# Altium footprint library FOC.PcbLib: 148 footprints (part 4 of 10)
Each footprint in its own frame and in the unit in brackets; x right, y up, seen from the top. Pads: shape width x height; smd on the part's side, far side on the other; paste and mask are expansions set on the pad; w line width, h text height; cw(c..) or ccw(c..) is an arc to the next point about the centre after c.
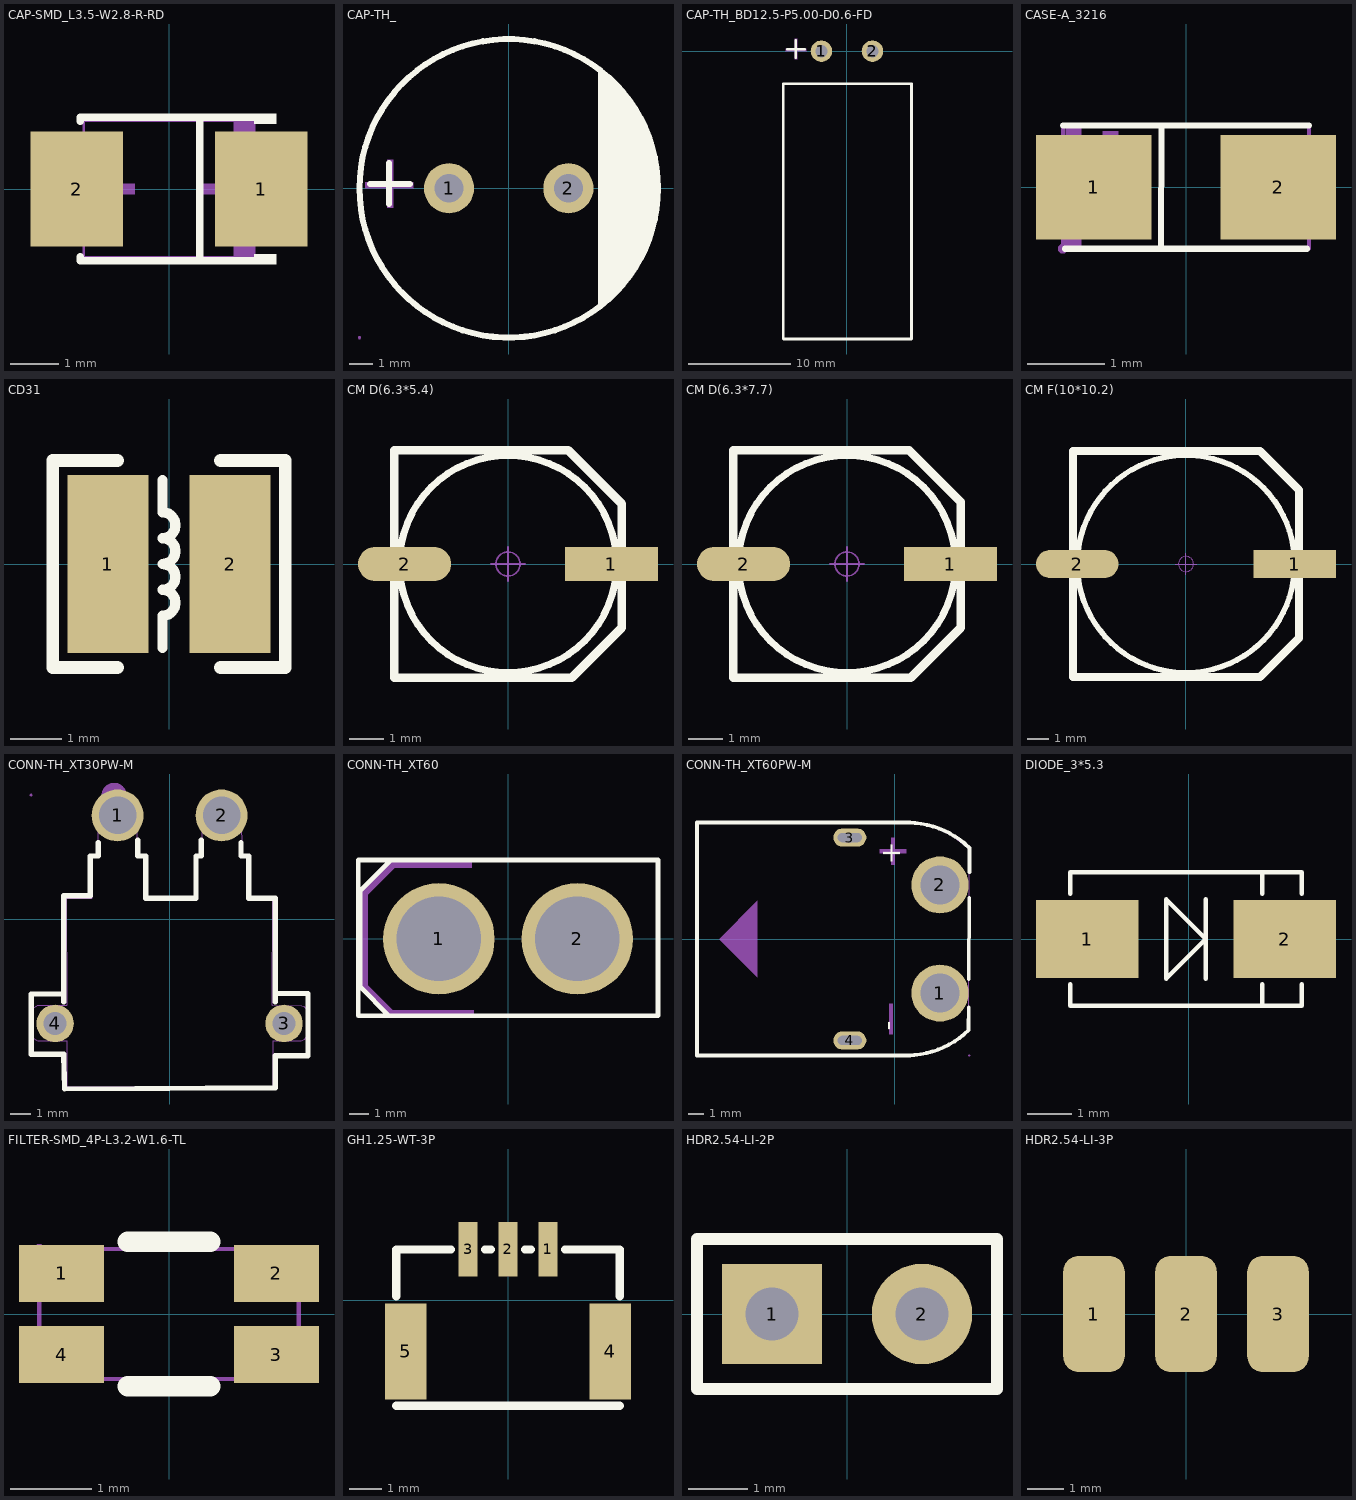
[diagram p3: the footprints below, top view; thin cyan lines are the x and y axes]

## CAP-SMD_L3.5-W2.8-R-RD [mm] "100uf"
pads (2):
  rect 1.9x2.376 smd mask+0.051: 1(1.899,0) 2(-1.899,0)
Top Overlay:
  region: 1.75,-1.552 1.75,-1.34 2.207,-1.34 2.207,-1.552
  region: 1.75,1.552 1.75,1.34 2.207,1.34 2.207,1.552
  lines w0.152: -1.826,-1.391 -1.826,-1.476 1.826,-1.476 ; -1.826,1.391 -1.826,1.476 1.826,1.476 ; 0.635,-1.476 0.635,1.476
Mechanical 6:
  region: 1.75,1.4 1.75,0.7 1.33,0.7 1.33,1.4
  region: 1.75,-1.4 1.75,-0.7 1.33,-0.7 1.33,-1.4
  region: 1.225,-0.7 1.225,0.7 1.015,0.7 1.015,-0.7
  region: 1.54,-0.105 1.54,0.105 0.7,0.105 0.7,-0.105
  region: -1.54,-0.105 -1.54,0.105 -0.7,0.105 -0.7,-0.105
Mechanical 15:
  region: 1.75,-1.1 1.75,1.1 1.05,1.1 1.05,-1.1
  region: -1.75,-1.1 -1.75,1.1 -1.05,1.1 -1.05,-1.1
  region: 1.81,1.4 1.81,1.425 1.775,1.46 1.725,1.46 1.69,1.425 1.69,1.4 1.69,1.375 1.725,1.34 1.775,1.34 1.81,1.375
  lines w0.051: -1.75,-1.4 1.75,-1.4 1.75,1.4 -1.75,1.4 -1.75,-1.4
3D body "CASE-B-3528.STEP": height 1.95, standoff -0.05, extent -1.85,-1.4 1.85,1.4

## CAP-TH_ [mm]
pads (2):
  round 2.1 hole 1.2 mask+0.05: 1(-2.5,0) 2(2.5,0)
Top Overlay:
  circle w0.254: c0,0 r6.25
  region: 3.75,5 3.75,-5 4.482,-4.268 4.692,-4.058 5.068,-3.6 5.397,-3.107 5.677,-2.584 5.904,-2.036 6.076,-1.468 6.192,-0.887 6.25,-0.297 6.25,0 6.25,0.297 6.192,0.887 6.076,1.468 5.904,2.036 5.677,2.584 5.397,3.107 5.068,3.6 4.692,4.058 4.482,4.268
  lines w0.254: -5.817,0.178 -4.14,0.178 ; -5.004,-0.66 -5.004,1.067
Mechanical 6:
  region: -5.092,-0.811 -5.092,1.189 -4.842,1.189 -4.842,-0.811
  region: -6,0.25 -4,0.25 -4,0 -6,0
Mechanical 15:
  region: 2.8,0 2.8,0.06 2.754,0.17 2.67,0.254 2.56,0.3 2.44,0.3 2.33,0.254 2.246,0.17 2.2,0.06 2.2,0 2.2,-0.06 2.246,-0.17 2.33,-0.254 2.44,-0.3 2.56,-0.3 2.67,-0.254 2.754,-0.17 2.8,-0.06
  region: -2.2,0 -2.2,0.06 -2.246,0.17 -2.33,0.254 -2.44,0.3 -2.56,0.3 -2.67,0.254 -2.754,0.17 -2.8,0.06 -2.8,0 -2.8,-0.06 -2.754,-0.17 -2.67,-0.254 -2.56,-0.3 -2.44,-0.3 -2.33,-0.254 -2.246,-0.17 -2.2,-0.06
  region: -6.19,-6.25 -6.19,-6.225 -6.225,-6.19 -6.275,-6.19 -6.31,-6.225 -6.31,-6.25 -6.31,-6.275 -6.275,-6.31 -6.225,-6.31 -6.19,-6.275
  lines w0.051: -6.25,0 ccw(c0,0) 6.25,0 ccw(c0,0) -6.25,0

## CAP-TH_BD12.5-P5.00-D0.6-FD [mm] "680uf  63V"
pads (2):
  round 2.1 hole 1.2 mask+0.05: 1(-2.5,0) 2(2.5,0)
Top Overlay:
  lines w0.254: -6.25,-28.175 -6.25,-3.175 6.25,-3.175 ; -6.177,-28.194 6.323,-28.194 6.323,-3.194 ; -5.817,0.178 -4.14,0.178 ; -5.004,-0.66 -5.004,1.067
Mechanical 6:
  region: -5.092,-0.811 -5.092,1.189 -4.842,1.189 -4.842,-0.811
  region: -6,0.25 -4,0.25 -4,0 -6,0
Mechanical 15:
  region: 2.8,0 2.8,0.06 2.754,0.17 2.67,0.254 2.56,0.3 2.44,0.3 2.33,0.254 2.246,0.17 2.2,0.06 2.2,0 2.2,-0.06 2.246,-0.17 2.33,-0.254 2.44,-0.3 2.56,-0.3 2.67,-0.254 2.754,-0.17 2.8,-0.06
  region: -2.2,0 -2.2,0.06 -2.246,0.17 -2.33,0.254 -2.44,0.3 -2.56,0.3 -2.67,0.254 -2.754,0.17 -2.8,0.06 -2.8,0 -2.8,-0.06 -2.754,-0.17 -2.67,-0.254 -2.56,-0.3 -2.44,-0.3 -2.33,-0.254 -2.246,-0.17 -2.2,-0.06
  region: -6.19,-6.25 -6.19,-6.225 -6.225,-6.19 -6.275,-6.19 -6.31,-6.225 -6.31,-6.25 -6.31,-6.275 -6.275,-6.31 -6.225,-6.31 -6.19,-6.275

## CASE-A_3216 [mm]
pads (2):
  rect 1.5x1.359 smd mask+0.051: 1(-1.2,0) 2(1.2,0)
Top Overlay:
  lines w0.08: -1.6,0.8 1.6,0.8 ; -1.575,-0.8 1.575,-0.8 ; -0.323,-0.8 -0.32,0.8
Mechanical 6:
  region: -1.081,0.724 -0.878,0.724 -0.878,-0.673 -1.081,-0.673
  region: -0.61,0.13 -0.61,-0.08 -1.45,-0.08 -1.45,0.13
  region: -1.363,-0.813 -1.567,-0.813 -1.567,-0.483 -1.363,-0.483
  region: -1.563,0.813 -1.36,0.813 -1.36,0.483 -1.563,0.483
  region: 1.501,0.13 1.501,-0.08 0.661,-0.08 0.661,0.13
Mechanical 15:
  region: 1.6,0.625 1.6,-0.575 0.8,-0.575 0.8,0.625
  region: -0.8,0.625 -0.8,-0.575 -1.6,-0.575 -1.6,0.625
  region: -1.54,-0.8 -1.54,-0.775 -1.575,-0.74 -1.625,-0.74 -1.66,-0.775 -1.66,-0.8 -1.66,-0.825 -1.625,-0.86 -1.575,-0.86 -1.54,-0.825
  lines w0.051: -1.6,-0.8 -1.6,0.8 1.6,0.8 1.6,-0.8 -1.6,-0.8
3D body "CASE-A-3216.STEP": height 1.7, standoff 0, extent -1.6,-0.8 1.6,0.8

## CD31 [mm] "3.5*3*1mm（长宽高）"
pads (2):
  rect 1.6x3.5 smd: 1(-1.2,0) 2(1.2,0)
Top Overlay:
  lines w0.203: -0.127,-1.651 -0.127,-1.016 ccw(c-0.127,-0.762) -0.127,-0.508 ccw(c-0.127,-0.254) -0.127,0 ccw(c-0.127,0.254) -0.127,0.508 ccw(c-0.127,0.762) -0.127,1.016 -0.127,1.651
  lines w0.254: -1.016,-2.032 -2.286,-2.032 -2.286,2.032 -1.016,2.032 ; 1.016,-2.032 2.286,-2.032 2.286,2.032 1.016,2.032
3D body "CD31.STEP": height 1.27, standoff 0.07, extent -1.718,-1.5 1.718,1.5

## CM D(6.3*5.4) [mm] "贴片电解电容，直径6.3mm，高5.4mm"
height 5.4
pads (2):
  rect 2.7x1 smd: 1(3,0)
  oval 2.7x1 smd: 2(-3,0)
Top Overlay:
  circle w0.2: c0,0 r3.15
  lines w0.254: -3.3,-3.3 1.85,-3.3 3.3,-1.85 3.3,1.75 1.75,3.3 -3.3,3.3 -3.3,-3.3
Mechanical 15:
  circle w0.05: c0,0 r0.35
  lines w0.05: -0.5,0 0.5,0 ; 0,-0.5 0,0.5
3D body "CM D(6.3X5.4).STEP": height 5.4, standoff -0.01, extent -3.5,-3.3 3.5,3.3

## CM D(6.3*7.7) [mm] "贴片电解电容，直径6.3mm，高7.7mm"
pads (2):
  rect 2.7x1 smd: 1(3,0)
  oval 2.7x1 smd: 2(-3,0)
Top Overlay:
  circle w0.2: c0,0 r3.15
  lines w0.254: -3.3,-3.3 1.85,-3.3 3.3,-1.85 3.3,1.8 1.8,3.3 -3.3,3.3 -3.3,-3.3
Mechanical 15:
  circle w0.05: c0,0 r0.35
  lines w0.05: -0.5,0 0.5,0 ; 0,-0.5 0,0.5
3D body "CM D(6.3X7.7).STEP": height 7.7, standoff -0.01, extent -3.5,-3.3 3.5,3.3

## CM F(10*10.2) [mm] "贴片电解电容，直径10mm，高10.2mm"
pads (2):
  rect 3.8x1.3 smd: 1(5,0)
  oval 3.8x1.3 smd: 2(-5,0)
Top Overlay:
  circle w0.254: c0,0 r5
  lines w0.381: 5.191,-3.413 3.404,-5.2 -5.2,-5.2 -5.2,5.2 3.404,5.2 5.2,3.404 5.2,-3.404
Mechanical 15:
  circle w0.05: c0,0 r0.35
  lines w0.05: -0.5,0 0.5,0 ; 0,-0.5 0,0.5
3D body "CM F(10X10.2).STEP": height 10.2, standoff -0.01, extent -5.8,-5.15 5.8,5.15

## CONN-TH_XT30PW-M [mm]
pads (4):
  round 2.5 hole 1.8 mask+0.051: 1(-2.5,5) 2(2.5,5)
  round 1.8 hole 1.1 mask+0.051: 3(5.5,-5) 4(-5.5,-5)
Top Overlay:
  lines w0.254: -5.08,-3.95 -5.08,0.047 -5.08,1.143 -3.81,1.143 -3.81,3.048 -3.429,3.048 -3.429,3.683 ; -5.08,-3.585 -6.65,-3.585 -6.65,-6.48 -5.08,-6.48 -5.05,-8.15 5.08,-8.091 5.08,-6.549 ; -1.524,3.81 -1.524,3.048 -1.143,3.048 -1.143,1.016 1.27,1.016 1.27,3.048 1.524,3.048 1.524,3.81 ; 3.429,3.683 3.429,3.048 3.81,3.048 3.81,1.016 5.08,1.016 5.08,0.047 5.08,-3.95 ; 5.08,-6.55 6.65,-6.55 6.65,-3.559 5.08,-3.559
Mechanical 6:
  circle w0.6: c-2.667,5.969 r0.3
Mechanical 15:
  drawing of 94 lines, arcs and shapes, not listed

## CONN-TH_XT60 [mm]
pads (2):
  round 5.8 hole 4.4 mask+0.05: 1(-3.6,0) 2(3.6,0)
Top Overlay:
  lines w0.254: -5.999,-4 -7.8,-4 -7.8,4.1 -6.101,4.1 ; -5.301,4.1 7.8,4.1 7.8,-4 -6.2,-4 -7.699,-2.499 -7.699,2.499 -6.101,4.1 ; -5.199,4.1 -6.101,4.1
Mechanical 6:
  region: -1.9,4.1 -6.1,4.1 -7.7,2.5 -7.7,-2.5 -6.2,-4 -1.8,-4 -1.8,-3.7 -6,-3.7 -7.3,-2.4 -7.3,2.3 -5.9,3.7 -1.9,3.7
Mechanical 15:
  region: 5.35,0 5.35,0.172 5.283,0.51 5.151,0.829 4.959,1.116 4.716,1.359 4.429,1.551 4.11,1.683 3.772,1.75 3.428,1.75 3.089,1.683 2.771,1.551 2.484,1.359 2.241,1.116 2.049,0.829 1.917,0.51 1.85,0.172 1.85,0 1.85,-0.172 1.917,-0.51 2.049,-0.829 2.241,-1.116 2.484,-1.359 2.771,-1.551 3.089,-1.683 3.428,-1.75 3.772,-1.75 4.11,-1.683 4.429,-1.551 4.716,-1.359 4.959,-1.116 5.151,-0.829 5.283,-0.51 5.35,-0.172
  region: -1.85,0 -1.85,0.172 -1.917,0.51 -2.049,0.829 -2.241,1.116 -2.484,1.359 -2.771,1.551 -3.089,1.683 -3.428,1.75 -3.772,1.75 -4.11,1.683 -4.429,1.551 -4.716,1.359 -4.959,1.116 -5.151,0.829 -5.283,0.51 -5.35,0.172 -5.35,0 -5.35,-0.172 -5.283,-0.51 -5.151,-0.829 -4.959,-1.116 -4.716,-1.359 -4.429,-1.551 -4.11,-1.683 -3.772,-1.75 -3.428,-1.75 -3.089,-1.683 -2.771,-1.551 -2.484,-1.359 -2.241,-1.116 -2.049,-0.829 -1.917,-0.51 -1.85,-0.172
  region: -7.69,-4.05 -7.69,-4.025 -7.725,-3.99 -7.775,-3.99 -7.81,-4.025 -7.81,-4.05 -7.81,-4.075 -7.775,-4.11 -7.725,-4.11 -7.69,-4.075
  lines w0.051: -7.75,-4.05 7.75,-4.05 7.75,4.05 -7.75,4.05 -7.75,-4.05

## CONN-TH_XT60PW-M [mm]
pads (4):
  round 3.8 hole 2.6 mask+0.05: 1(3,-3.6) 2(3,3.6)
  oval 2.2x1.2 hole 0.6 slot 1.6 at 0 deg copper offset 0,0 mask+0.05: 3(-3,6.75)
  oval 2.2x1.2 hole 0.6 slot 1.6 at 0 deg mask+0.05: 4(-3,-6.75)
Top Overlay:
  lines w0.254: 0.889,-7.747 ccw(c0.746,-1.749) 4.917,-6.062 ; 0.937,7.747 cw(c0.794,1.749) 4.965,6.062 4.956,4.441 ; 1,-7.75 -13.166,-7.75 -13.166,7.75 1,7.75 ; 4.902,-5.994 4.909,-4.544 ; 4.919,-2.676 4.947,2.738
  text "-" at 0.11,-6.096 h1.33
  text "+" at 0.364,4.953 h1.33
Mechanical 6:
  region: -9.144,2.54 -9.144,-2.54 -11.684,0
  region: -0.254,6.731 0,6.731 0,5.969 0.762,5.969 0.762,5.715 0,5.715 0,4.953 -0.254,4.953 -0.254,5.715 -1.016,5.715 -1.016,5.969 -0.254,5.969
  region: -0.381,-4.318 -0.127,-4.318 -0.127,-6.35 -0.381,-6.35
Mechanical 15:
  region: 5.013,-7.747 5.013,-7.722 4.978,-7.687 4.928,-7.687 4.893,-7.722 4.893,-7.747 4.893,-7.772 4.928,-7.807 4.978,-7.807 5.013,-7.772
  region: 4,3.6 4,3.732 3.932,3.986 3.8,4.214 3.614,4.4 3.386,4.532 3.132,4.6 2.868,4.6 2.614,4.532 2.386,4.4 2.2,4.214 2.068,3.986 2,3.732 2,3.6 2,3.468 2.068,3.214 2.2,2.986 2.386,2.8 2.614,2.668 2.868,2.6 3.132,2.6 3.386,2.668 3.614,2.8 3.8,2.986 3.932,3.214 4,3.468
  region: 4,-3.6 4,-3.468 3.932,-3.214 3.8,-2.986 3.614,-2.8 3.386,-2.668 3.132,-2.6 2.868,-2.6 2.614,-2.668 2.386,-2.8 2.2,-2.986 2.068,-3.214 2,-3.468 2,-3.6 2,-3.732 2.068,-3.986 2.2,-4.214 2.386,-4.4 2.614,-4.532 2.868,-4.6 3.132,-4.6 3.386,-4.532 3.614,-4.4 3.8,-4.214 3.932,-3.986 4,-3.732
  region: -2.4,6.95 -2.4,6.55 -3.6,6.55 -3.6,6.95
  region: -2.4,-6.55 -2.4,-6.95 -3.6,-6.95 -3.6,-6.55
  lines w0.051: -13.166,-7.747 1.143,-7.747 2.159,-7.493 3.175,-7.239 3.937,-6.858 4.699,-6.223 4.902,-5.994 4.953,5.969 4.826,6.096 3.81,6.858 2.794,7.366 1.778,7.62 1.016,7.747 -13.166,7.747 -13.166,-7.747

## DIODE_3*5.3 [mm]
pads (2):
  rect 2.3x1.75 smd: 1(-2.286,0) 2(2.159,0)
Top Overlay:
  lines w0.1: -2.667,-1.016 -2.667,-1.5 2.54,-1.5 2.54,-1.016 ; -2.667,1.016 -2.667,1.5 2.54,1.5 2.54,1.016 ; 0.381,-0.889 0.381,0.889 ; 1.651,-1.5 1.651,-1.016 ; 1.651,1.016 1.651,1.5 ; -0.508,-0.889 0.381,0 -0.508,0.889 -0.508,-0.889
3D body "SMA(DO-214AC).STEP": height 2, standoff -0.1, extent -2.6,-1.4 2.6,1.4

## FILTER-SMD_4P-L3.2-W1.6-TL [mm]
pads (4):
  rect 1.05x0.7 smd mask+0.051: 1(-1.325,0.5) 2(1.325,0.5) 3(1.325,-0.5) 4(-1.325,-0.5)
Top Overlay:
  lines w0.254: -0.508,-0.889 0.508,-0.889 ; -0.508,0.889 0.508,0.889
Mechanical 15:
  region: -0.9,-0.8 -1.6,-0.8 -1.6,-0.2 -0.9,-0.2
  region: -0.9,0.2 -1.6,0.2 -1.6,0.8 -0.9,0.8
  region: 1.6,0.2 0.9,0.2 0.9,0.8 1.6,0.8
  region: 1.6,-0.8 0.9,-0.8 0.9,-0.2 1.6,-0.2
  region: -1.54,0.8 -1.54,0.825 -1.575,0.86 -1.625,0.86 -1.66,0.825 -1.66,0.8 -1.66,0.775 -1.625,0.74 -1.575,0.74 -1.54,0.775
  lines w0.051: -1.6,-0.8 1.6,-0.8 1.6,0.8 -1.6,0.8 -1.6,-0.8

## GH1.25-WT-3P [mm] "GH1.25 2P 卧贴插座"
pads (5):
  rect 0.6x1.7 smd: 1(1.25,1.6) 2(0,1.6) 3(-1.25,1.6)
  rect 1.3x3 smd: 4(3.2,-1.6) 5(-3.2,-1.6)
Top Overlay:
  lines w0.254: -3.5,-3.3 3.5,-3.3 ; -3.5,0.131 -3.5,1.6 -1.781,1.6 ; -0.719,1.6 -0.531,1.6 ; 0.531,1.6 0.719,1.6 ; 1.78,1.6 3.5,1.6 3.5,0.131
3D body "3D Model.STEP": height 4.26, standoff 0, extent -3.499,-2.856 3.499,2.003

## HDR2.54-LI-2P [mm] "排针，2脚"
pads (2):
  rect 1.7x1.7 hole 0.9: 1(-1.27,0)
  round 1.7 hole 0.9: 2(1.27,0)
Top Overlay:
  lines w0.2: -2.54,-1.27 2.54,-1.27 2.54,1.27 -2.54,1.27 -2.54,-1.27
3D body "HDR2.54-1P.STEP": height 8.5, standoff -3, extent -2.54,-1.27 0,1.27
3D body "HDR2.54-1P.STEP": height 8.5, standoff -3, extent 0,-1.27 2.54,1.27

## HDR2.54-LI-3P [mm] "排针，3脚"
pads (3):
  rrect50% 1.7x3.2 smd: 1(-2.54,0) 2(0,0) 3(2.54,0)
3D body "HDR2.54-1P.STEP": height 1.61, standoff -0.93, extent 1.276,-10.372 3.816,1.128
3D body "HDR2.54-1P.STEP": height 1.62, standoff -0.92, extent -1.264,-10.372 1.276,1.128
3D body "HDR2.54-1P.STEP": height 1.62, standoff -0.92, extent -3.804,-10.372 -1.264,1.128